# Altium footprint library BKRES_PcbLib.PcbLib: 33 footprints (part 2 of 3)
Each footprint in its own frame and in the unit in brackets; x right, y up, seen from the top. Pads: shape width x height; smd on the part's side, far side on the other; paste and mask are expansions set on the pad; w line width, h text height; cw(c..) or ccw(c..) is an arc to the next point about the centre after c.
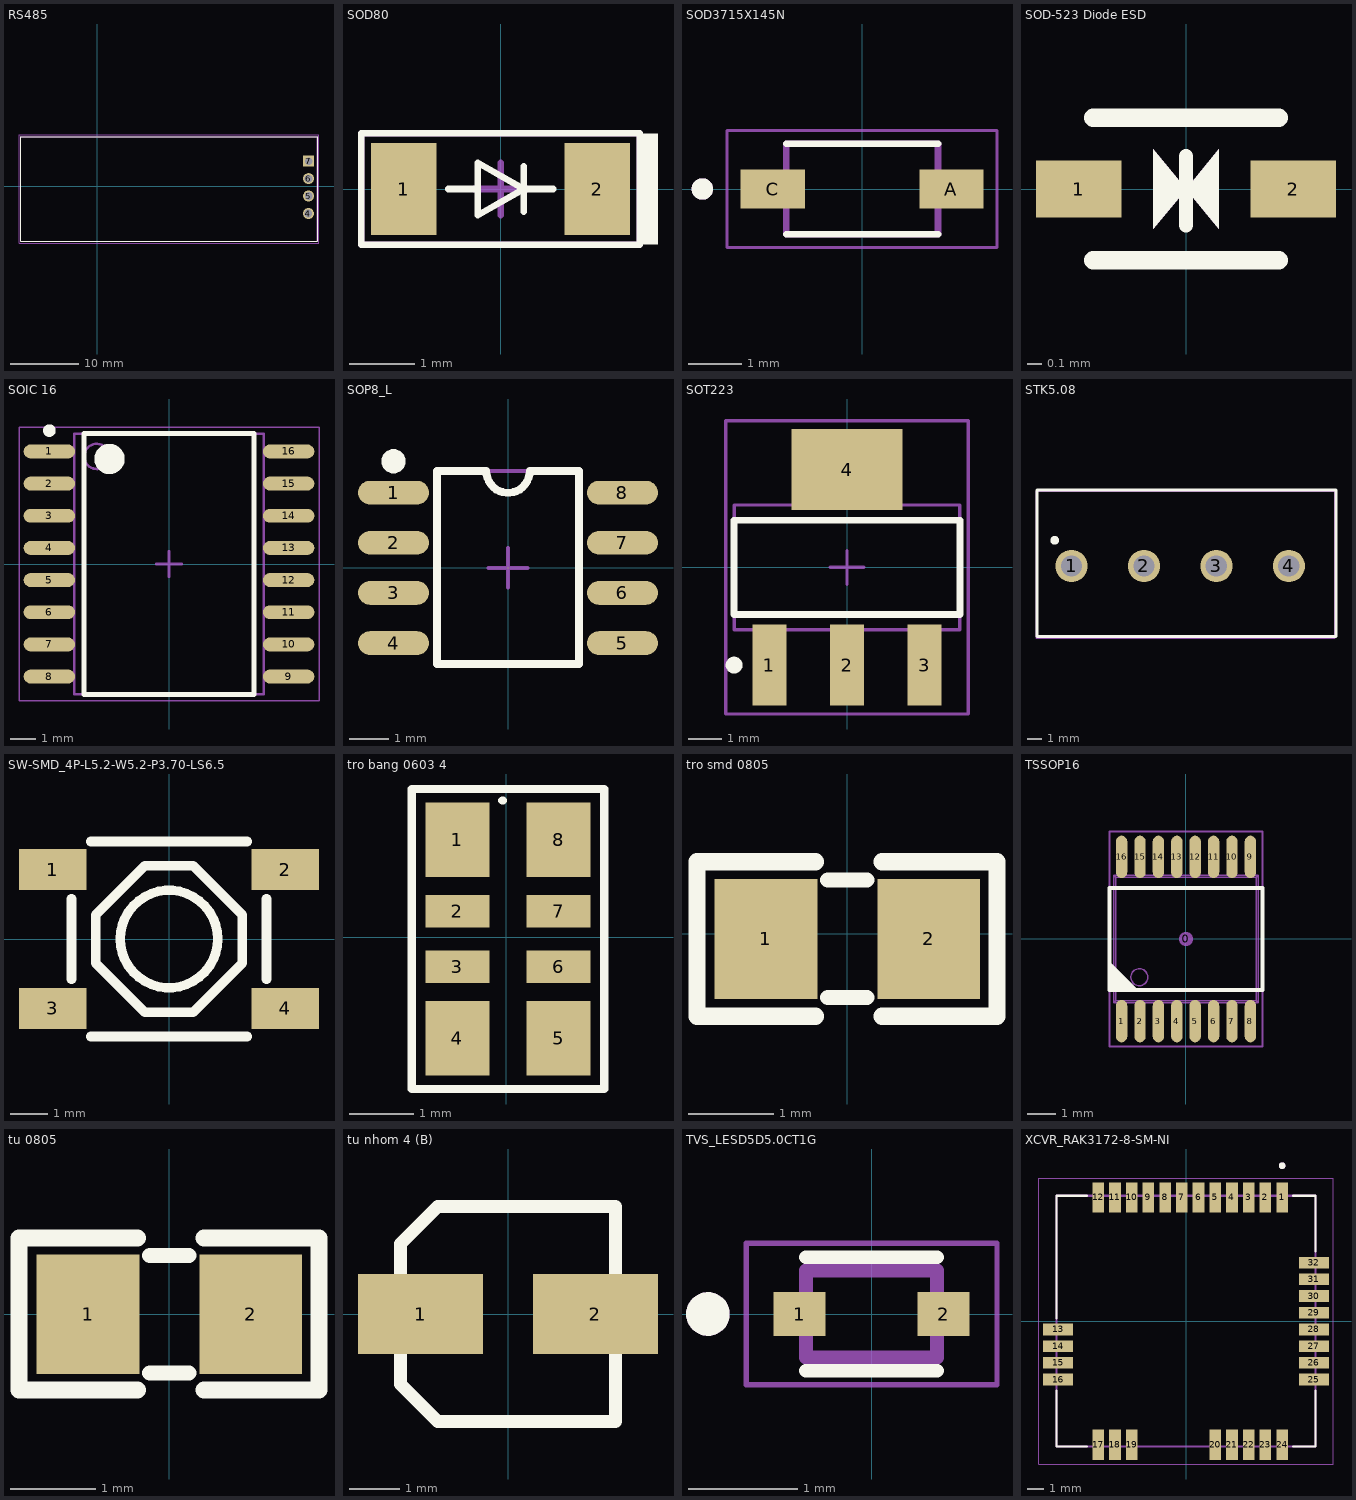
[diagram p1: the footprints below, top view; thin cyan lines are the x and y axes]

## RS485 [mm]
pads (4):
  round 1.6 hole 1.1: 4(30.723,-3.951) 5(30.738,-1.404) 6(30.732,1.139)
  rect 1.6x1.6 hole 1.1: 7(30.736,3.682)
Top Overlay:
  lines w0.127: -11.176,-8.001 -11.176,7.239 32.004,7.239 32.004,-8.001 -11.176,-8.001
Mechanical 13:
  lines w0.127: -11.176,-8.001 -11.176,7.239 32.004,7.239 32.004,-8.001 -11.176,-8.001
Mechanical 15:
  lines w0.05: -11.43,-8.255 32.258,-8.255 32.258,7.493 -11.43,7.493 -11.43,-8.255
3D body "15EDGK-5.08-03P-14-00A(H).stp": height 19.67, standoff 8.57, extent -25.135,-7.969 -9.635,7.271
3D body "15EDGRC-5.08- 03P-14-00A(H).stp": height 19.2, standoff 8.6, extent -17.925,-7.991 -8.725,7.249
3D body "HW-0519 v1 (1).step": height 13.15, standoff 11, extent -11.176,-8.001 32.004,7.239

## SOD80 [mm] "Diodes - General Purpose"
pads (2):
  rect 1x1.4 smd: 1(-1.475,0) 2(1.475,0)
Top Overlay:
  region: 2.4,0.85 2.1,0.85 2.1,-0.85 2.4,-0.85
  lines w0.1: -0.8,0 -0.35,0 ; 0.35,-0.35 0.35,0.35 ; 0.8,0 0.35,0 ; 0.35,0 -0.35,-0.4 -0.35,0.4 0.35,0 ; -2.125,-0.85 2.125,-0.85 2.125,0.85 -2.125,0.85 -2.125,-0.85
Mechanical 13:
  lines w0.1: -2.125,-0.85 -2.125,0.85 2.125,0.85 2.125,-0.85 -2.125,-0.85
Mechanical 15:
  lines w0.1: -0.4,0 0.4,0 ; 0,-0.4 0,0.4
3D body "User Library-smd diode 1206.STEP": height 1.43, standoff -0.02, extent -1.74,-0.72 1.76,0.73

## SOD3715X145N [mm]
pads (2):
  rect 1.21x0.73 smd: A(1.68,0) C(-1.68,0)
Top Overlay:
  circle w0.2: c-3,0 r0.1
  lines w0.127: -1.425,-0.85 1.425,-0.85 ; -1.425,0.85 1.425,0.85
Mechanical 13:
  circle w0.2: c-3,0 r0.1
  lines w0.127: -1.425,-0.85 -1.425,0.85 1.425,0.85 1.425,-0.85 -1.425,-0.85
Mechanical 15:
  lines w0.05: -2.535,-1.1 -2.535,1.1 2.535,1.1 2.535,-1.1 -2.535,-1.1
3D body "step_temp.STEP": height 0.8, standoff -0.73, extent -1.825,-0.775 1.825,0.775

## SOD-523 Diode ESD [mm]
pads (2):
  rect 0.6x0.4 smd paste+0 mask+0.051: 1(-0.75,0) 2(0.75,0)
Top Overlay:
  region: 0,0 0.229,0.279 0.229,-0.279
  region: 0,0 -0.229,-0.279 -0.229,0.279
  lines w0.1: 0,-0.254 0,0.229
  lines w0.13: -0.65,-0.5 0.65,-0.5 ; -0.65,0.5 0.65,0.5
Mechanical 15:
  region: -0.229,0.279 -0.229,-0.279 0,0
  region: 0.229,0.279 0.229,-0.279 0,0

## SOIC 16 [mm] "SOIC, 16-Leads, Body 10.30x7.50mm, Pitch 1.27mm, IPC Medium Density"
height 2.4
pads (16):
  oval 2.032x0.55 smd: 1(-4.725,4.445) 2(-4.725,3.175) 3(-4.725,1.905) 4(-4.725,0.635) 5(-4.725,-0.635) 6(-4.725,-1.905) 7(-4.725,-3.175) 8(-4.725,-4.445) 9(4.725,-4.445) 10(4.725,-3.175) 11(4.725,-1.905) 12(4.725,-0.635) 13(4.725,0.635) 14(4.725,1.905) 15(4.725,3.175) 16(4.725,4.445)
Top Overlay:
  circle w0.25: c-4.725,5.27 r0.125
  circle w0.6: c-2.35,4.15 r0.3
  lines w0.2: -3.35,-5.15 -3.35,5.15 3.35,5.15 3.35,-5.15 -3.35,-5.15
Mechanical 13:
  circle w0.1: c-2.85,4.25 r0.5
  lines w0.1: -3.75,-5.15 -3.75,5.15 3.75,5.15 3.75,-5.15 -3.75,-5.15
Mechanical 15:
  lines w0.05: -5.925,-5.4 -5.925,5.4 5.925,5.4 5.925,-5.4 -5.925,-5.4
  lines w0.1: -0.5,0 0.5,0 ; 0,-0.5 0,0.5
3D body "User Library-SO-16W.STEP": height 2.48, standoff 0, extent -5.155,-5.165 5.155,5.165

## SOP8_L [mm] "SOIC, 8-Leads, Body 4.9x3.9mm, Pitch 1.27mm, IPC High Density"
height 1.75
pads (8):
  oval 1.8x0.6 smd: 1(-2.9,1.905) 2(-2.9,0.635) 3(-2.9,-0.635) 4(-2.9,-1.905) 5(2.9,-1.905) 6(2.9,-0.635) 7(2.9,0.635) 8(2.9,1.905)
Top Overlay:
  region: -2.9,2.4 -2.96,2.4 -3.07,2.446 -3.154,2.53 -3.2,2.64 -3.2,2.7 -3.2,2.76 -3.154,2.87 -3.07,2.954 -2.96,3 -2.9,3 -2.84,3 -2.73,2.954 -2.646,2.87 -2.6,2.76 -2.6,2.7 -2.6,2.64 -2.646,2.53 -2.73,2.446 -2.84,2.4
  lines w0.2: -1.8,-2.44 -1.8,2.45 -0.55,2.45 ccw(c0,2.45) 0.55,2.45 1.8,2.45 1.8,-2.44 -1.8,-2.44
Mechanical 13:
  lines w0.1: -1.8,-2.44 -1.8,2.45 1.8,2.45 1.8,-2.44 -1.8,-2.44
Mechanical 15:
  lines w0.1: -0.5,0 0.5,0 ; 0,-0.5 0,0.5
3D body "User Library-SOIC-8-1.STEP": height 1.75, standoff 0, extent -3.01,-2.45 2.99,2.45

## SOT223 [mm]
pads (4):
  rect 1x2.4 smd: 1(-2.3,-2.9) 2(0,-2.9) 3(2.3,-2.9)
  rect 3.3x2.4 smd: 4(0,2.9)
Top Overlay:
  circle w0.25: c-3.35,-2.9 r0.125
  lines w0.2: -3.35,-1.4 -3.35,1.4 3.35,1.4 3.35,-1.4 -3.35,-1.4
Mechanical 13:
  lines w0.1: -3.35,-1.85 -3.35,1.85 3.35,1.85 3.35,-1.85 -3.35,-1.85
Mechanical 15:
  lines w0.1: -0.5,0 0.5,0 ; 0,-0.5 0,0.5 ; -3.6,-4.35 -3.6,4.35 3.6,4.35 3.6,-4.35 -3.6,-4.35
3D body "SW3DPS-SOT-223-DEFAULT.step": height 1.68, standoff 0, extent -3.25,-3.556 3.25,3.404

## STK5.08 [mm]
pads (4):
  round 2.25 hole 1.5: 1(-22.276,-12.751) 2(-17.196,-12.751) 3(-12.116,-12.751) 4(-7.036,-12.751)
Top Overlay:
  circle w0.4: c-23.456,-10.951 r0.1
  lines w0.2: -24.689,-17.704 -24.689,-7.417 -3.734,-7.417 -3.734,-17.704 -24.689,-17.704
Mechanical 13:
  lines w0.1: -24.765,-17.805 -24.765,-7.518 -3.81,-7.518 -3.81,-17.805 -24.765,-17.805
3D body "KF128-5.08-4P.STEP": height 14.19, standoff -3.76, extent -24.79,-17.78 -3.87,-7.48

## SW-SMD_4P-L5.2-W5.2-P3.70-LS6.5 [mm]
pads (4):
  rect 1.8x1.1 smd paste+0 mask+0.051: 1(-3.1,1.85) 2(3.1,1.85) 3(-3.1,-1.85) 4(3.1,-1.85)
Top Overlay:
  circle w0.254: c0,0 r1.3
  lines w0.254: -2.6,-1.069 -2.6,1.069 ; -2.087,-2.6 2.087,-2.6 ; -2.087,2.6 2.087,2.6 ; 2.6,-1.069 2.6,1.069 ; -1.95,-0.65 -1.95,0.65 -0.65,1.95 0.65,1.95 1.95,0.65 1.95,-0.65 0.65,-1.95 -0.65,-1.95 -1.95,-0.65
3D body "Ts-1252_1.7.stp": height 1.7, standoff 0, extent -3.25,-2.6 3.25,2.6

## tro bang 0603 4 [mil]
height 300
pads (8):
  rect 39.37x45.67 smd: 1(-30,60) 4(-30,-62) 5(32,-62) 8(32,60)
  rect 39.37x20 smd: 2(-30.06,16.08) 3(-30,-18.08) 6(32.06,-18.08) 7(32.06,16.08)
Top Overlay:
  lines w5: -2.5,84 -2,84 ; -58,-93 -58,91 -47.81,91 -37.44,91 -27.25,91 60,91 60,-93 -58,-93
3D body "Tro bang smd0805.step": height 21.65, standoff 0, extent -29.5,-63.98 33.5,62

## tro smd 0805 [mm]
pads (2):
  rect 1.2x1.4 smd: 1(-0.946,-0.061) 2(0.954,-0.061)
Top Overlay:
  lines w0.178: -0.224,-0.747 0.233,-0.747 ; -0.224,0.625 0.233,0.625
  lines w0.2: -0.367,-0.965 -1.75,-0.965 -1.75,0.838 -0.367,0.838 ; 0.408,-0.965 1.75,-0.965 1.75,0.838 0.408,0.838
3D body "Tro 0805.STEP": height 0.53, standoff 0, extent -1.562,-0.763 1.438,0.637

## TSSOP16 [mm]
height 1.1
pads (17):
  round 0.508 on Mech15: 0(0,0)
  oval 0.4x1.5 smd paste-0.051: 1(-2.275,-2.9) 2(-1.625,-2.9) 3(-0.975,-2.9) 4(-0.325,-2.9) 5(0.325,-2.9) 6(0.975,-2.9) 7(1.625,-2.9) 8(2.275,-2.9) 9(2.275,2.9) 10(1.625,2.9) 11(0.975,2.9) 12(0.325,2.9) 13(-0.325,2.9) 14(-0.975,2.9) 15(-1.625,2.9) 16(-2.275,2.9)
Top Overlay:
  region: -2.7,-1.8 -2.7,-0.8 -1.7,-1.8
  lines w0.152: -2.7,-1.8 2.7,-1.8 2.7,1.8 -2.7,1.8 -2.7,-1.8
  text "." at -3,-2.85 h0.76
Top Solder:
  region: 2.4,-3.5 2.4,-2.3 -2.4,-2.3 -2.4,-3.5
  region: -2.4,3.5 -2.4,2.3 2.4,2.3 2.4,3.5
Mechanical 13:
  circle w0.05: c-1.65,-1.35 r0.3
  lines w0.05: -2.425,-2.839 -2.125,-2.839 ; -2.425,-2.795 -2.125,-2.795 ; -2.425,-2.693 -2.125,-2.693 ; -2.425,-2.5 -2.125,-2.5 ; -2.425,-2.25 -2.425,-3.25 -2.125,-3.25 -2.125,-2.25 ; -2.425,2.25 -2.425,3.25 -2.125,3.25 -2.125,2.25 ; -2.425,2.5 -2.125,2.5 ; -2.425,2.693 -2.125,2.693 ; -2.425,2.795 -2.125,2.795 ; -2.425,2.839 -2.125,2.839 ; -1.775,-2.839 -1.475,-2.839 ; -1.775,-2.795 -1.475,-2.795 ; -1.775,-2.693 -1.475,-2.693 ; -1.775,-2.5 -1.475,-2.5 ; -1.775,-2.25 -1.775,-3.25 -1.475,-3.25 -1.475,-2.25 ; -1.775,2.25 -1.775,3.25 -1.475,3.25 -1.475,2.25 ; -1.775,2.5 -1.475,2.5 ; -1.775,2.693 -1.475,2.693 ; -1.775,2.795 -1.475,2.795 ; -1.775,2.839 -1.475,2.839 ; -1.125,-2.839 -0.825,-2.839 ; -1.125,-2.795 -0.825,-2.795 ; -1.125,-2.693 -0.825,-2.693 ; -1.125,-2.5 -0.825,-2.5 ; -1.125,-2.25 -1.125,-3.25 -0.825,-3.25 -0.825,-2.25 ; -1.125,2.25 -1.125,3.25 -0.825,3.25 -0.825,2.25 ; -1.125,2.5 -0.825,2.5 ; -1.125,2.693 -0.825,2.693 ; -1.125,2.795 -0.825,2.795 ; -1.125,2.839 -0.825,2.839 ; -0.475,-2.839 -0.175,-2.839 ; -0.475,-2.795 -0.175,-2.795 ; -0.475,-2.693 -0.175,-2.693 ; -0.475,-2.5 -0.175,-2.5 ; -0.475,-2.25 -0.475,-3.25 -0.175,-3.25 -0.175,-2.25 ; -0.475,2.25 -0.475,3.25 -0.175,3.25 -0.175,2.25 ; -0.475,2.5 -0.175,2.5 ; -0.475,2.693 -0.175,2.693 ; -0.475,2.795 -0.175,2.795 ; -0.475,2.839 -0.175,2.839 ; 0.175,-2.839 0.475,-2.839 ; 0.175,-2.795 0.475,-2.795 ; 0.175,-2.693 0.475,-2.693 ; 0.175,-2.5 0.475,-2.5 ; 0.175,-2.25 0.175,-3.25 0.475,-3.25 0.475,-2.25 ; 0.175,2.25 0.175,3.25 0.475,3.25 0.475,2.25 ; 0.175,2.5 0.475,2.5 ; 0.175,2.693 0.475,2.693 ; 0.175,2.795 0.475,2.795 ; 0.175,2.839 0.475,2.839 ; 0.825,-2.839 1.125,-2.839 ; 0.825,-2.795 1.125,-2.795 ; 0.825,-2.693 1.125,-2.693 ; 0.825,-2.5 1.125,-2.5 ; 0.825,-2.25 0.825,-3.25 1.125,-3.25 1.125,-2.25 ; 0.825,2.25 0.825,3.25 1.125,3.25 1.125,2.25 ; 0.825,2.5 1.125,2.5 ; 0.825,2.693 1.125,2.693 ; 0.825,2.795 1.125,2.795 ; 0.825,2.839 1.125,2.839 ; 1.475,-2.839 1.775,-2.839 ; 1.475,-2.795 1.775,-2.795 ; 1.475,-2.693 1.775,-2.693 ; 1.475,-2.5 1.775,-2.5 ; 1.475,-2.25 1.475,-3.25 1.775,-3.25 1.775,-2.25 ; 1.475,2.25 1.475,3.25 1.775,3.25 1.775,2.25 ; 1.475,2.5 1.775,2.5 ; 1.475,2.693 1.775,2.693 ; 1.475,2.795 1.775,2.795 ; 1.475,2.839 1.775,2.839 ; 2.125,-2.839 2.425,-2.839 ; 2.125,-2.795 2.425,-2.795 ; 2.125,-2.693 2.425,-2.693 ; 2.125,-2.5 2.425,-2.5 ; 2.125,-2.25 2.125,-3.25 2.425,-3.25 2.425,-2.25 ; 2.125,2.25 2.125,3.25 2.425,3.25 2.425,2.25 ; 2.125,2.5 2.425,2.5 ; 2.125,2.693 2.425,2.693 ; 2.125,2.795 2.425,2.795 ; 2.125,2.839 2.425,2.839 ; -2.55,-2.25 2.55,-2.25 ; -2.55,-2.25 -2.55,2.25 ; -2.55,-2.25 -2.487,-2.187 ; -2.55,2.25 2.55,2.25 ; -2.55,2.25 -2.487,2.187 ; -2.487,-2.187 2.487,-2.187 ; -2.487,-2.187 -2.487,2.187 ; -2.487,2.187 2.487,2.187 ; 2.487,-2.187 2.487,2.187 ; 2.487,-2.187 2.55,-2.25 ; 2.487,2.187 2.55,2.25 ; 2.55,-2.25 2.55,2.25
Mechanical 15:
  lines w0.076: -2.7,-3.8 2.7,-3.8 2.7,3.8 -2.7,3.8 -2.7,-3.8
3D body "TSSOP65P640X120-16N.STEP": height 1.2, standoff 0, extent -2.55,-3.25 2.55,3.25

## tu 0805 [mm] "Compoment SMD 80x50mil"
height 1.27
pads (2):
  rect 1.2x1.4 smd: 1(-0.946,-0.003) 2(0.954,-0.003)
Top Overlay:
  lines w0.178: -0.224,-0.689 0.233,-0.689 ; -0.224,0.682 0.233,0.682
  lines w0.2: -0.367,-0.889 -1.753,-0.889 -1.753,0.889 -0.367,0.889 ; 0.408,-0.889 1.753,-0.889 1.753,0.889 0.408,0.889
3D body "SW3dPS-smt_resistor_packages.STEP": height 0.61, standoff -0.01, extent -1.006,-0.638 1.014,0.632

## tu nhom 4 (B) [mm]
pads (2):
  rect 2.5x1.6 smd: 1(-1.75,0) 2(1.75,0)
Top Overlay:
  lines w0.254: -2.15,-1.406 -2.15,1.406 -1.406,2.15 2.15,2.15 2.15,-2.15 -1.406,-2.15 -2.15,-1.406
3D body "aluminum capacitor 4mm.STEP": height 3.91, standoff 0, extent -2.314,-2.15 2.286,2.15

## TVS_LESD5D5.0CT1G [mm]
height 0.7
pads (2):
  rect 0.48x0.4 smd: 1(-0.66,0) 2(0.66,0)
Top Overlay:
  circle w0.2: c-1.5,0 r0.1
  lines w0.127: -0.6,-0.52 0.6,-0.52 ; -0.6,0.52 0.6,0.52
Mechanical 13:
  circle w0.2: c-1.5,0 r0.1
  lines w0.127: -0.6,-0.4 0.6,-0.4 0.6,0.4 -0.6,0.4 -0.6,-0.4
Mechanical 15:
  lines w0.05: -1.15,-0.65 -1.15,0.65 1.15,0.65 1.15,-0.65 -1.15,-0.65
3D body "step_temp.STEP": height 0.7, standoff 0, extent -0.8,-0.4 0.8,0.4

## XCVR_RAK3172-8-SM-NI [mm]
height 2.6
pads (32):
  rect 0.7x1.8 smd: 1(5.75,7.4) 2(4.75,7.4) 3(3.75,7.4) 4(2.75,7.4) 5(1.75,7.4) 6(0.75,7.4) 7(-0.25,7.4) 8(-1.25,7.4) 9(-2.25,7.4) 10(-3.25,7.4) 11(-4.25,7.4) 12(-5.25,7.4) 17(-5.25,-7.4) 18(-4.25,-7.4) 19(-3.25,-7.4) 20(1.75,-7.4) 21(2.75,-7.4) 22(3.75,-7.4) 23(4.75,-7.4) 24(5.75,-7.4)
  rect 1.8x0.7 smd: 13(-7.65,-0.5) 14(-7.65,-1.5) 15(-7.65,-2.5) 16(-7.65,-3.5) 25(7.65,-3.5) 26(7.65,-2.5) 27(7.65,-1.5) 28(7.65,-0.5) 29(7.65,0.5) 30(7.65,1.5) 31(7.65,2.5) 32(7.65,3.5)
Top Overlay:
  circle w0.2: c5.75,9.3 r0.1
  lines w0.127: -7.75,-4.17 -7.75,-7.5 -5.92,-7.5 ; -7.75,0.17 -7.75,7.5 -5.92,7.5 ; 6.42,-7.5 7.75,-7.5 7.75,-4.17 ; 6.42,7.5 7.75,7.5 7.75,4.17
Mechanical 13:
  circle w0.2: c5.75,9.3 r0.1
  lines w0.127: -7.75,-7.5 -7.75,7.5 7.75,7.5 7.75,-7.5 -7.75,-7.5
Mechanical 15:
  lines w0.05: -8.8,-8.55 -8.8,8.55 8.8,8.55 8.8,-8.55 -8.8,-8.55
3D body "RAK3172--3DModel-STEP-100311 (1).STEP": height 3.54, standoff 0.03, extent -7.749,-7.519 7.751,7.481